# Altium footprint library Kon_Tipk.PCBLIB: 113 footprints (part 1 of 8)
Each footprint in its own frame and in the unit in brackets; x right, y up, seen from the top. Pads: shape width x height; smd on the part's side, far side on the other; paste and mask are expansions set on the pad; w line width, h text height; cw(c..) or ccw(c..) is an arc to the next point about the centre after c.
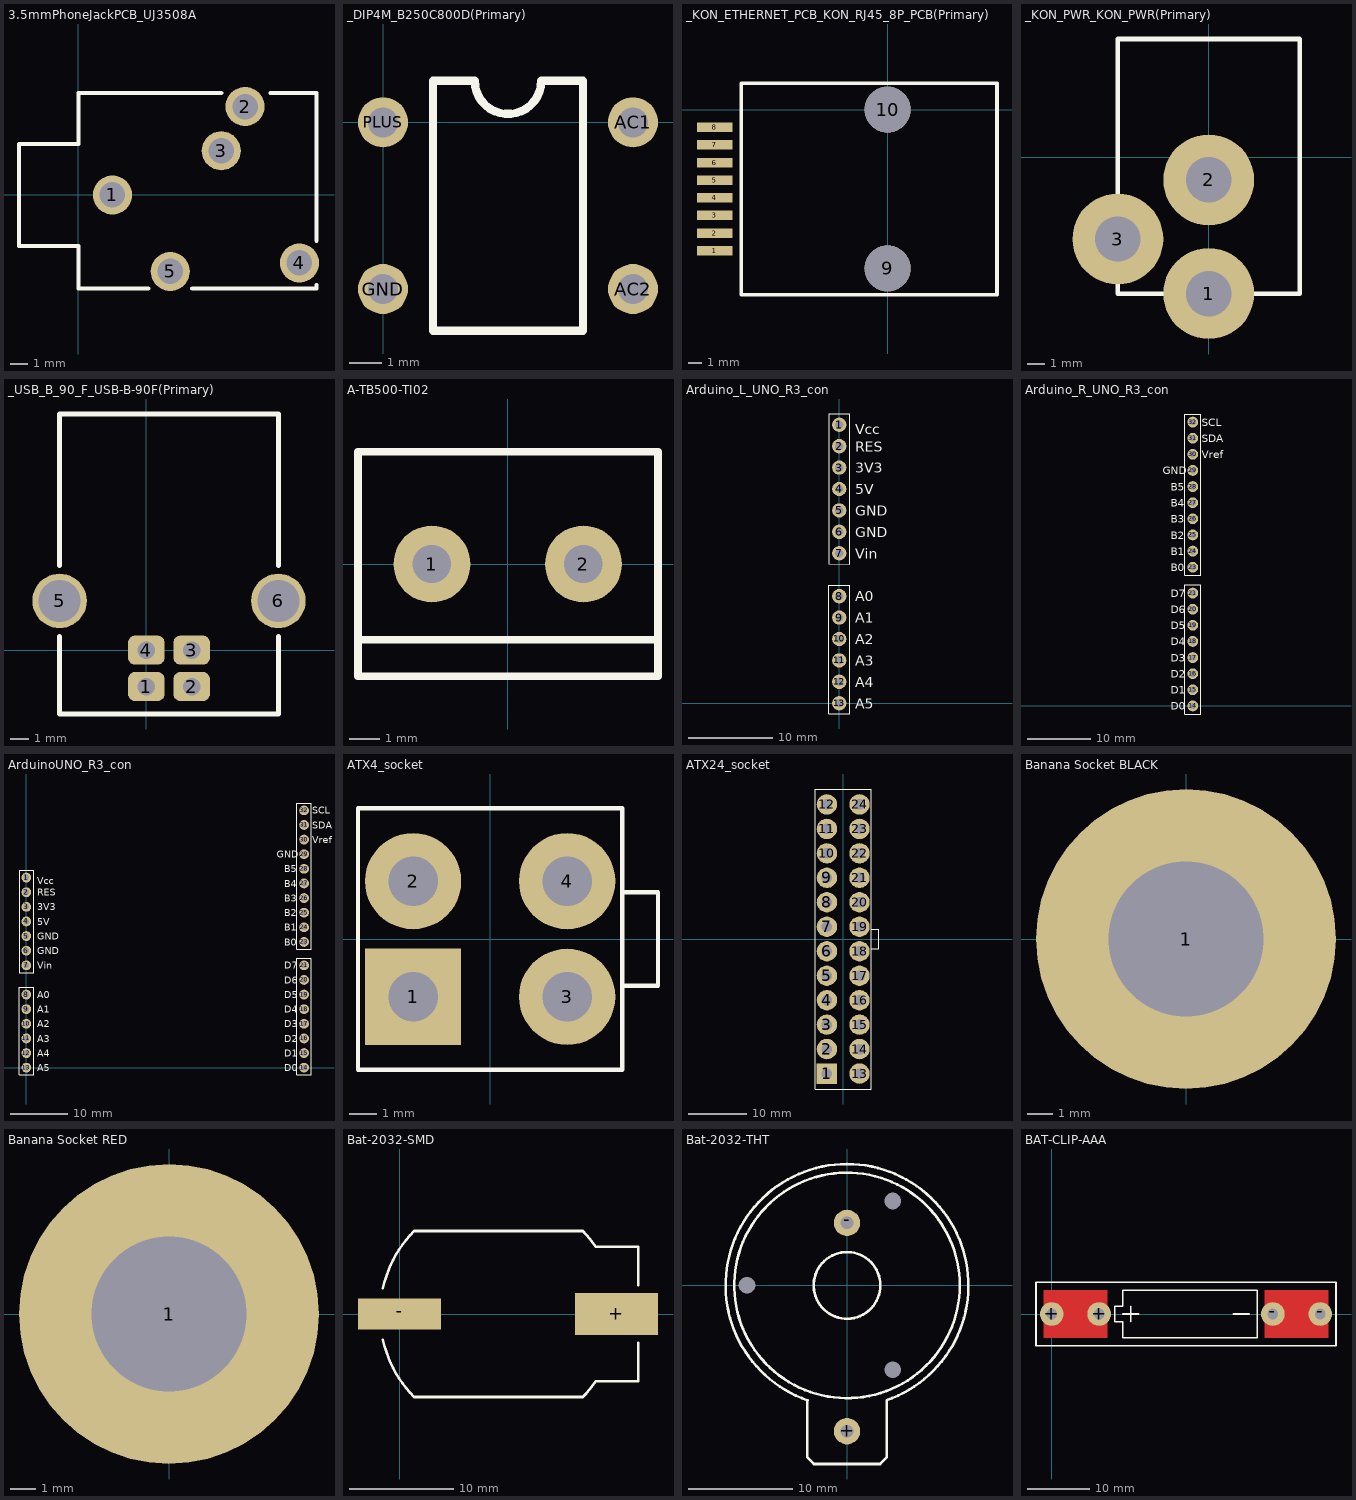
[diagram p0: the footprints below, top view; thin cyan lines are the x and y axes]

## 3.5mmPhoneJackPCB_UJ3508A [mm] "3.5mm Phone Jack for PCB UJ-3508-A"
height 6
pads (5):
  round 2.3 hole 1.5: 1(2,0) 2(9.8,5.2) 3(8.4,2.6) 4(13,-4) 5(5.4,-4.5)
Top Overlay:
  lines w0.254: 4.1,-5.5 0,-5.5 0,-3 -3.5,-3 -3.5,3 0,3 0,6 8.4,6 ; 6.7,-5.5 14,-5.5 14,-5.3 ; 11.3,6 14,6 14,-2.7
3D body "sj1-3515.stp": height 6.01, standoff -2.99, extent -3.6,-5.55 13.9,5.95

## _DIP4M_B250C800D(Primary) [mil]
pads (4):
  round 60 hole 36: AC1(300,0) AC2(300,-200) GND(0,-200) PLUS(0,0)
Top Overlay:
  lines w10: 60,-250 60,50 110,50 ccw(c150,50) 190,50 240,50 240,-250 60,-250

## _KON_ETHERNET_PCB_KON_RJ45_8P_PCB(Primary) [mil]
pads (10):
  rect 100x27 smd: 1(-490.16,-400) 2(-490.16,-350) 3(-490.16,-300) 4(-490.16,-250) 5(-490.16,-200) 6(-490.16,-150) 7(-490.16,-100) 8(-490.16,-50)
  round 130 hole 130 unplated: 9(0,-450) 10(0,0)
Top Overlay:
  lines w10: -415.16,-525 309.84,-525 309.84,75 -415.16,75 -415.16,-525

## _KON_PWR_KON_PWR(Primary) [mil]
pads (3):
  round 200 hole 100: 1(0,-300) 2(0,-50) 3(-200,-180)
Top Overlay:
  lines w10: -200,-300 -200,260 200,260 200,-300 -200,-300

## _USB_B_90_F_USB-B-90F(Primary) [mm]
pads (6):
  rrect50% 2.032x1.6 hole 0.965: 1(0,-2.005) 2(2.5,-2.005) 3(2.5,-0.005) 4(0,-0.005)
  round 3 hole 2.3: 5(-4.77,2.705) 6(7.27,2.705)
Top Overlay:
  lines w0.254: -4.77,0.75 -4.77,-3.515 7.27,-3.515 7.27,0.75 ; -4.77,4.65 -4.77,12.985 7.27,12.985 7.27,4.65

## A-TB500-TI02 [mm] "TERMINAL BLOCK ASSMANN WSW A-TB500-TI02"
pads (2):
  round 2.54 hole 1.27: 1(-2.5,0) 2(2.5,0)
Top Overlay:
  lines w0.254: 4.96,-2.5 -4.94,-2.5 ; -4.94,-2.5 -4.94,3.7 4.96,3.7 4.96,-3.7 -4.94,-3.7 -4.94,-2.5
3D body "terminal_blocks_a-tb500-ti02.stp": height 14.21, standoff -3.49, extent -5.004,-5.506 5.596,4.795

## Arduino_L_UNO_R3_con [mm] "Left Header placement for Arduino UNO R3"
pads (13):
  round 1.7 hole 1: 1(0,33.02) 2(0,30.48) 3(0,27.94) 4(0,25.4) 5(0,22.86) 6(0,20.32) 7(0,17.78) 8(0,12.7) 9(0,10.16) 10(0,7.62) 11(0,5.08) 12(0,2.54) 13(0,0)
Top Overlay:
  lines w0.1: -1.27,-1.27 -1.27,13.97 1.27,13.97 1.27,-1.27 -1.27,-1.27 ; -1.27,16.51 -1.27,34.29 1.27,34.29 1.27,16.51 -1.27,16.51
  text "A5" at 1.905,-0.635 h1.2
  text "A1" at 1.905,9.525 h1.2
  text "A3" at 1.905,4.445 h1.2
  text "A4" at 1.905,1.905 h1.2
  text "A0" at 1.905,12.065 h1.2
  text "A2" at 1.905,6.985 h1.2
  text "5V" at 1.905,24.765 h1.2
  text "Vcc" at 1.905,31.877 h1.2
  text "GND" at 1.905,19.685 h1.2
  text "Vin" at 1.905,17.145 h1.2
  text "GND" at 1.905,22.225 h1.2
  text "3V3" at 1.905,27.305 h1.2
  text "RES" at 1.905,29.845 h1.2

## Arduino_R_UNO_R3_con [mm] "Right Header placement for Arduino UNO R3"
pads (18):
  round 1.7 hole 1: 14(48.26,0) 15(48.26,2.54) 16(48.26,5.08) 17(48.26,7.62) 18(48.26,10.16) 19(48.26,12.7) 20(48.26,15.24) 21(48.26,17.78) 23(48.26,21.844) 24(48.26,24.384) 25(48.26,26.924) 26(48.26,29.464) 27(48.26,32.004) 28(48.26,34.544) 29(48.26,37.084) 30(48.26,39.624) 31(48.26,42.164) 32(48.26,44.704)
Top Overlay:
  lines w0.1: 46.99,-1.27 46.99,19.05 49.53,19.05 49.53,-1.27 46.99,-1.27 ; 46.99,20.574 49.53,20.574 49.53,45.974 46.99,45.974 46.99,20.574
  text "SCL" at 49.645,44.069 h1.2
  text "SDA" at 49.645,41.529 h1.2
  text "B5" at 44.815,33.909 h1.2
  text "D0" at 44.815,-0.635 h1.2
  text "D1" at 44.815,1.905 h1.2
  text "D2" at 44.815,4.445 h1.2
  text "D3" at 44.815,6.985 h1.2
  text "D4" at 44.79,9.525 h1.2
  text "D5" at 44.815,12.065 h1.2
  text "D6" at 44.815,14.605 h1.2
  text "D7" at 44.815,17.145 h1.2
  text "B0" at 44.815,21.209 h1.2
  text "B1" at 44.815,23.749 h1.2
  text "B2" at 44.815,26.289 h1.2
  text "B3" at 44.815,28.829 h1.2
  text "B4" at 44.79,31.369 h1.2
  text "GND" at 43.545,36.449 h1.2
  text "Vref" at 49.645,38.989 h1.2

## ArduinoUNO_R3_con [mm] "Header placement for Arduino UNO R3"
pads (31):
  round 1.7 hole 1: 1(0,33.02) 2(0,30.48) 3(0,27.94) 4(0,25.4) 5(0,22.86) 6(0,20.32) 7(0,17.78) 8(0,12.7) 9(0,10.16) 10(0,7.62) 11(0,5.08) 12(0,2.54) 13(0,0) 14(48.26,0) 15(48.26,2.54) 16(48.26,5.08) 17(48.26,7.62) 18(48.26,10.16) 19(48.26,12.7) 20(48.26,15.24) 21(48.26,17.78) 23(48.26,21.844) 24(48.26,24.384) 25(48.26,26.924) 26(48.26,29.464) 27(48.26,32.004) 28(48.26,34.544) 29(48.26,37.084) 30(48.26,39.624) 31(48.26,42.164) 32(48.26,44.704)
Top Overlay:
  lines w0.1: -1.27,-1.27 1.27,-1.27 1.27,13.97 -1.27,13.97 -1.27,-1.27 ; -1.27,16.51 1.27,16.51 1.27,34.29 -1.27,34.29 -1.27,16.51 ; 46.99,-1.27 46.99,19.05 49.53,19.05 49.53,-1.27 46.99,-1.27 ; 46.99,20.574 49.53,20.574 49.53,45.974 46.99,45.974 46.99,20.574
  text "SCL" at 49.645,44.069 h1.2
  text "SDA" at 49.645,41.529 h1.2
  text "B5" at 44.815,33.909 h1.2
  text "D0" at 44.815,-0.635 h1.2
  text "D1" at 44.815,1.905 h1.2
  text "D2" at 44.815,4.445 h1.2
  text "D3" at 44.815,6.985 h1.2
  text "D4" at 44.79,9.525 h1.2
  text "D5" at 44.815,12.065 h1.2
  text "D6" at 44.815,14.605 h1.2
  text "D7" at 44.815,17.145 h1.2
  text "B0" at 44.815,21.209 h1.2
  text "B1" at 44.815,23.749 h1.2
  text "B2" at 44.815,26.289 h1.2
  text "B3" at 44.815,28.829 h1.2
  text "B4" at 44.79,31.369 h1.2
  text "GND" at 43.545,36.449 h1.2
  text "Vref" at 49.645,38.989 h1.2
  text "RES" at 1.905,29.845 h1.2
  text "3V3" at 1.905,27.305 h1.2
  text "GND" at 1.905,22.225 h1.2
  text "Vin" at 1.905,17.145 h1.2
  text "GND" at 1.905,19.685 h1.2
  text "Vcc" at 1.905,31.877 h1.2
  text "5V" at 1.905,24.765 h1.2
  text "A2" at 1.905,6.985 h1.2
  text "A0" at 1.905,12.065 h1.2
  text "A4" at 1.905,1.905 h1.2
  text "A3" at 1.905,4.445 h1.2
  text "A1" at 1.905,9.525 h1.2
  text "A5" at 1.905,-0.635 h1.2

## ATX4_socket [mm]
pads (4):
  rect 3.5x3.5 hole 1.8: 1(-2.8,-2.1)
  round 3.5 hole 1.8: 2(-2.8,2.1) 3(2.8,-2.1) 4(2.8,2.1)
Top Overlay:
  lines w0.15: 4.8,-1.7 6.1,-1.7 6.1,1.7 4.8,1.7 ; -4.8,-4.75 4.8,-4.75 4.8,4.75 -4.8,4.75 -4.8,-4.75
DesignatorDoc:
  text ".Designator" at 0,0 h2.5
3D body "ATX-4-1775099-0.stp": height 12.81, standoff -3.19, extent -4.8,-4.75 6.1,4.75

## ATX24_socket [mm]
pads (24):
  rect 3.5x3.5 hole 1.8: 1(-2.8,-23.1)
  round 3.5 hole 1.8: 2(-2.8,-18.9) 3(-2.8,-14.7) 4(-2.8,-10.5) 5(-2.8,-6.3) 6(-2.8,-2.1) 7(-2.8,2.1) 8(-2.8,6.3) 9(-2.8,10.5) 10(-2.8,14.7) 11(-2.8,18.9) 12(-2.8,23.1) 13(2.8,-23.1) 14(2.8,-18.9) 15(2.8,-14.7) 16(2.8,-10.5) 17(2.8,-6.3) 18(2.8,-2.1) 19(2.8,2.1) 20(2.8,6.3) 21(2.8,10.5) 22(2.8,14.7) 23(2.8,18.9) 24(2.8,23.1)
Top Overlay:
  lines w0.15: 4.8,-1.7 6.1,-1.7 6.1,1.7 4.8,1.7 ; -4.8,-25.75 -4.8,25.75 4.8,25.75 4.8,-25.75 -4.8,-25.75
DesignatorDoc:
  text ".Designator" at 0,0 h2.5
3D body "ATX-4-1775099-8.stp": height 12.81, standoff -3.19, extent -4.8,-25.75 6.1,25.75

## Banana Socket BLACK [mm]
pads (1):
  round 12 hole 6.2 unplated: 1(0,0)
3D body "User Library-ST-351B V1 - BLACK.STEP": height 8.31, standoff -7.69, extent -11.584,-5.65 5.65,5.65

## Banana Socket RED [mm]
pads (1):
  round 12 hole 6.2 unplated: 1(0,0)
3D body "User Library-ST-351A V1 - RED.STEP": height 8.3, standoff -7.7, extent -11.584,-5.65 5.65,5.65

## Bat-2032-SMD [mm] "CR2032 Bat holder SMD"
pads (2):
  rect 8x4 smd: +(20.9,0)
  rect 8x3 smd: -(0,0)
Top Overlay:
  lines w0.254: -1.604,-2.473 ccw(c9.525,0) 1.401,-7.997 ; -1.604,2.473 cw(c9.525,0) 1.4,7.996 ; 1.4,8.001 17.65,8.001 ; 1.401,-8.001 17.653,-8.001 ; 17.649,-7.997 ccw(c9.525,0) 18.912,-6.469 ; 17.65,7.996 cw(c9.525,0) 18.913,6.468 ; 18.923,-6.477 22.987,-6.477 22.987,-2.794 ; 18.926,6.477 22.987,6.477 22.987,2.794

## Bat-2032-THT [mm] "CR2032 Bat holder THT"
pads (5):
  round 2.54 hole 1.2: +(0,-14) -(0,6)
  round 0 hole 1.6 unplated: ""(-9.6,0) ""(4.4,-8.1) ""(4.4,8.1)
Top Overlay:
  circle w0.254: c0,0 r3.2
  circle w0.254: c0,0 r10.822
  lines w0.254: -3.81,-11.049 -3.81,-16.51 -3.175,-17.145 3.175,-17.145 3.81,-16.51 3.81,-11.049 ; -3.795,-11.019 cw(c0,0) 3.799,-11.017
3D body "User Library-BATTERY HOLDER CR2032.step": height 7.72, standoff -3.18, extent -11.5,-16.866 11.5,11.634

## BAT-CLIP-AAA [mil] "--UNVERIFIED!!!-- AAA Battery holder clips"
pads (4):
  round 150 hole 67: +(0,0) +(300,0) -(1400,0) -(1700,0)
Top Layer:
  region: 1350,150 1750,150 1750,-150 1350,-150
  region: -50,150 350,150 350,-150 -50,-150
Top Overlay:
  lines w10: 450,0 550,0 ; 500,-50 500,50 ; 1150,0 1250,0 ; -100,-200 -100,200 1800,200 1800,-200 -100,-200 ; 400,-50 450,-50 450,-150 1300,-150 1300,150 450,150 450,100 450,50 400,50 400,-50